# Altium footprint library domino-rising-cage-clamp.PcbLib: 435 footprints (part 6 of 28)
Each footprint in its own frame and in the unit in brackets; x right, y up, seen from the top. Pads: shape width x height; smd on the part's side, far side on the other; paste and mask are expansions set on the pad; w line width, h text height; cw(c..) or ccw(c..) is an arc to the next point about the centre after c.
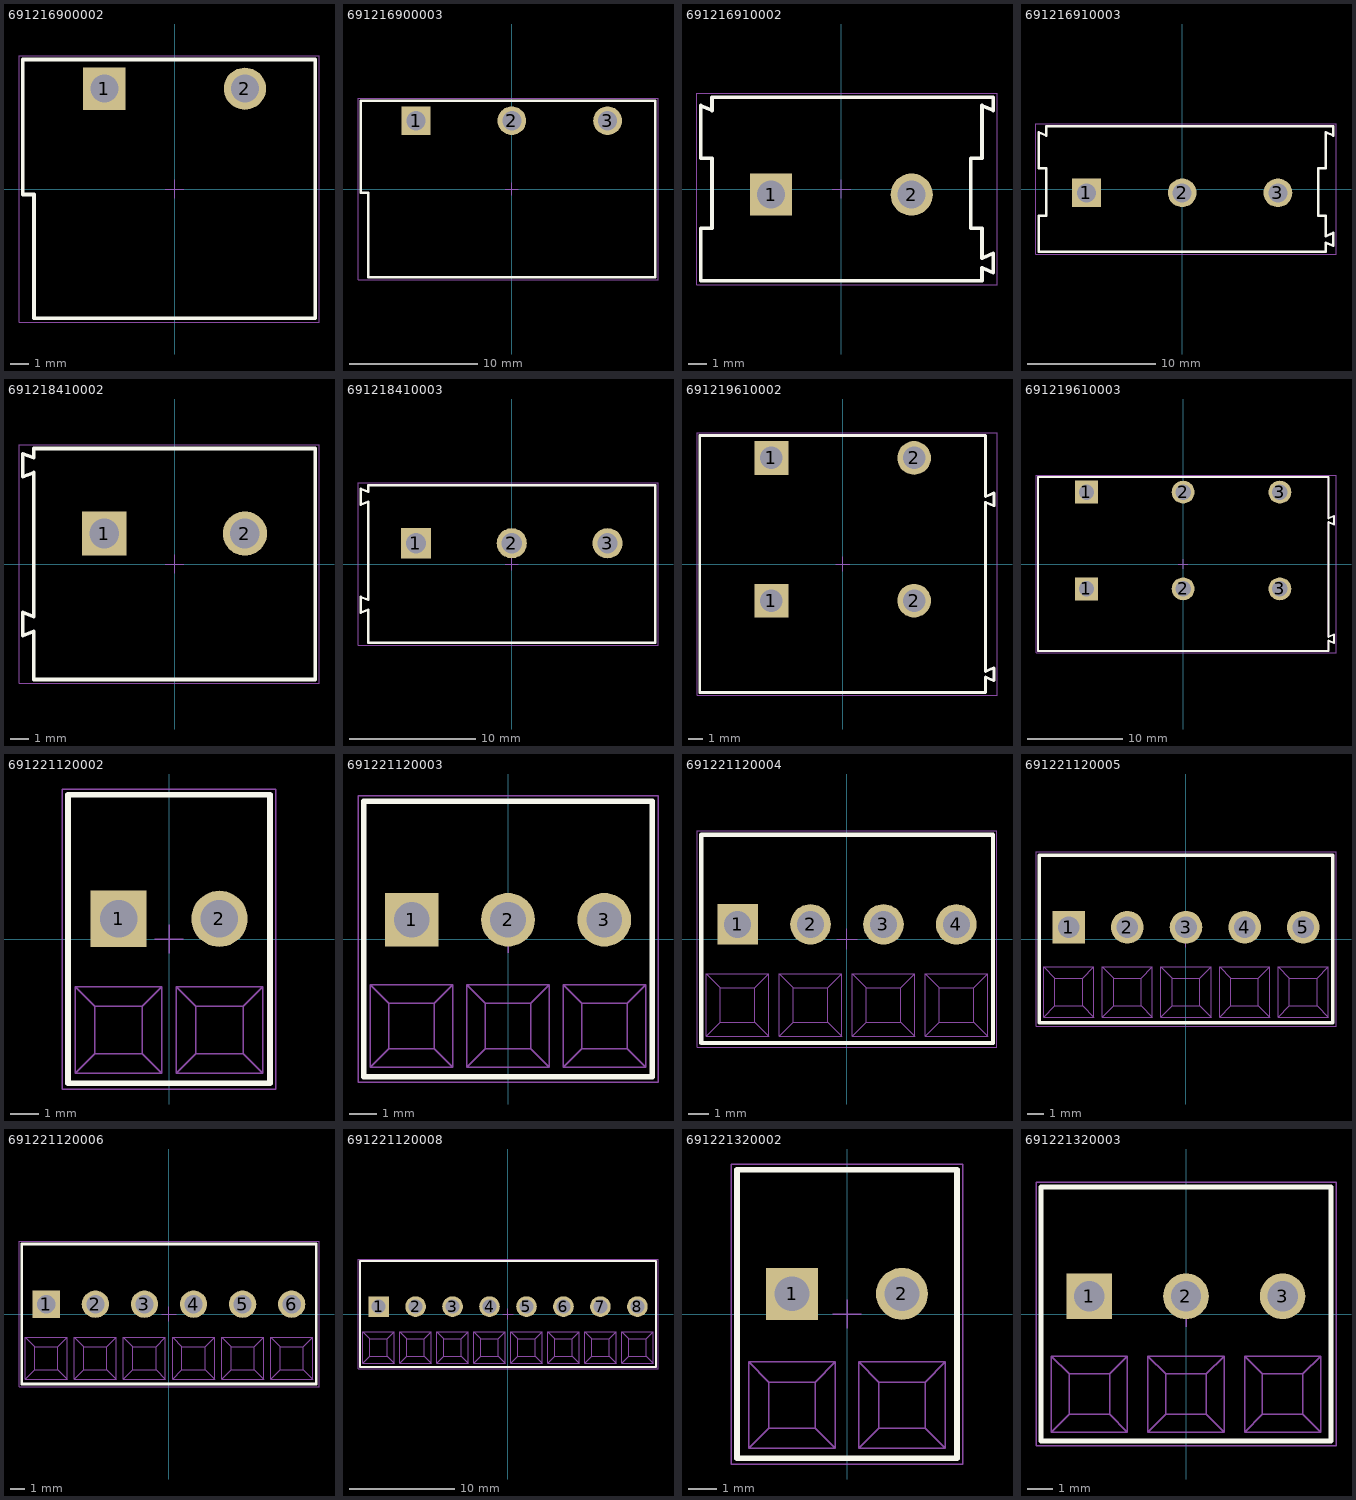
[diagram p5: the footprints below, top view; thin cyan lines are the x and y axes]

## 691216900002 [mm] "Vertical Cable Entry with Rising Cage Clamp, pitch 7.5mm, 02p"
height 9.8
pads (2):
  rect 2.25x2.25 hole 1.5: 1(-3.75,5.35)
  round 2.25 hole 1.5: 2(3.75,5.35)
Top Overlay:
  lines w0.2: -8.1,-0.3 -7.5,-0.3 -7.5,-6.9 7.5,-6.9 7.5,6.9 -8.1,6.9 -8.1,-0.3
Mechanical 13:
  lines w0.1: -8.1,-0.3 -8.1,6.9 7.5,6.9 7.5,-6.9 -7.5,-6.9 -7.5,-0.3 -8.1,-0.3
Mechanical 15:
  lines w0.05: -0.5,0 0.5,0 ; 0,-0.5 0,0.5 ; -8.3,-7.1 -8.3,7.1 7.7,7.1 7.7,-7.1 -8.3,-7.1
3D body "691216900002.stp": height 9.9, standoff -3.4, extent -8.1,-6.9 7.5,6.9

## 691216900003 [mm] "Vertical Cable Entry with Rising Cage Clamp, pitch 7.5mm, 03p"
height 9.8
pads (3):
  rect 2.25x2.25 hole 1.5: 1(-7.5,5.35)
  round 2.25 hole 1.5: 2(0,5.35) 3(7.5,5.35)
Top Overlay:
  lines w0.2: -11.85,-0.3 -11.25,-0.3 -11.25,-6.9 11.25,-6.9 11.25,6.9 -11.85,6.9 -11.85,-0.3
Mechanical 13:
  lines w0.1: -11.85,-0.3 -11.85,6.9 11.25,6.9 11.25,-6.9 -11.25,-6.9 -11.25,-0.3 -11.85,-0.3
Mechanical 15:
  lines w0.05: -0.5,0 0.5,0 ; 0,-0.5 0,0.5 ; -12.05,-7.1 -12.05,7.1 11.45,7.1 11.45,-7.1 -12.05,-7.1
3D body "691216900003.stp": height 9.9, standoff -3.4, extent -11.85,-6.9 11.25,6.9

## 691216910002 [mm] "Serie 2169 - 7.50 mm _ 2 pins"
height 13.8
pads (2):
  rect 2.25x2.25 hole 1.5: 1(-3.75,-0.3)
  round 2.25 hole 1.5: 2(3.75,-0.3)
Top Overlay:
  lines w0.2: -7.5,-4.9 -7.5,-2.09 -6.9,-2.09 -6.9,1.64 -7.5,1.64 -7.5,4.45 -6.9,4.19 -6.9,4.9 8.1,4.9 8.1,4.19 7.5,4.45 7.5,1.64 6.9,1.64 6.9,-2.09 7.5,-2.09 7.5,-3.69 8.1,-3.43 8.1,-4.46 7.5,-4.2 7.5,-4.9 -7.5,-4.9
Mechanical 13:
  lines w0.1: -7.5,-4.9 7.5,-4.9 7.5,-4.2 8.1,-4.46 8.1,-3.43 7.5,-3.69 7.5,-2.09 6.9,-2.09 6.9,1.64 7.5,1.64 7.5,4.45 8.1,4.19 8.1,4.9 -6.9,4.9 -6.9,4.19 -7.5,4.45 -7.5,1.64 -6.9,1.64 -6.9,-2.09 -7.5,-2.09 -7.5,-4.9
Mechanical 15:
  lines w0.05: -0.5,0 0.5,0 ; 0,-0.5 0,0.5 ; -7.7,-5.1 8.3,-5.1 8.3,5.1 -7.7,5.1 -7.7,-5.1
3D body "691216910002.stp": height 13.85, standoff -3.45, extent -7.5,-4.9 8.1,4.9

## 691216910003 [mm] "Serie 2169 - 7.50 mm _ 3 pins"
height 13.8
pads (3):
  rect 2.25x2.25 hole 1.5: 1(-7.5,-0.3)
  round 2.25 hole 1.5: 2(0,-0.3) 3(7.5,-0.3)
Top Overlay:
  lines w0.2: -11.25,-4.9 11.25,-4.9 11.25,-4.2 11.85,-4.46 11.85,-3.43 11.25,-3.69 11.25,-2.09 10.65,-2.09 10.65,1.64 11.25,1.64 11.25,4.45 11.85,4.19 11.85,4.9 -10.65,4.9 -10.65,4.19 -11.25,4.45 -11.25,1.64 -10.65,1.64 -10.65,-2.09 -11.25,-2.09 -11.25,-4.9
Mechanical 13:
  lines w0.1: -11.25,-4.9 -11.25,-2.09 -10.65,-2.09 -10.65,1.64 -11.25,1.64 -11.25,4.45 -10.65,4.19 -10.65,4.9 11.85,4.9 11.85,4.19 11.25,4.45 11.25,1.64 10.65,1.64 10.65,-2.09 11.25,-2.09 11.25,-3.69 11.85,-3.43 11.85,-4.46 11.25,-4.2 11.25,-4.9 -11.25,-4.9
Mechanical 15:
  lines w0.05: -0.5,0 0.5,0 ; 0,-0.5 0,0.5 ; -11.45,-5.1 -11.45,5.1 12.05,5.1 12.05,-5.1 -11.45,-5.1
3D body "691216910003.stp": height 13.85, standoff -3.45, extent -11.25,-4.9 11.85,4.9

## 691218410002 [mm] "Horizontal Entry Modular with Rising Cage Clamp, pitch 7.62mm, 2pin"
height 21.5
pads (2):
  rect 2.4x2.4 hole 1.6: 1(-3.81,1.65)
  round 2.4 hole 1.6: 2(3.81,1.65)
Top Overlay:
  lines w0.2: -8.22,-3.875 -8.22,-2.625 -7.62,-2.85 -7.62,4.95 -8.22,4.725 -8.22,5.975 -7.62,5.75 -7.62,6.25 7.62,6.25 7.62,-6.25 -7.62,-6.25 -7.62,-3.65 -8.22,-3.875
Mechanical 13:
  lines w0.1: -8.22,-3.875 -7.62,-3.65 -7.62,-6.25 7.62,-6.25 7.62,6.25 -7.62,6.25 -7.62,5.75 -8.22,5.975 -8.22,4.725 -7.62,4.95 -7.62,-2.85 -8.22,-2.625 -8.22,-3.875
Mechanical 15:
  lines w0.05: -0.5,0 0.5,0 ; 0,-0.5 0,0.5 ; -8.42,-6.45 -8.42,6.45 7.82,6.45 7.82,-6.45 -8.42,-6.45
3D body "691218410002.stp": height 21.53, standoff -4.17, extent -8.21,-6.25 7.63,6.25

## 691218410003 [mm] "Horizontal Entry Modular with Rising Cage Clamp, pitch 7.62mm, 3pin"
height 21.5
pads (3):
  rect 2.4x2.4 hole 1.6: 1(-7.62,1.65)
  round 2.4 hole 1.6: 2(0,1.65) 3(7.62,1.65)
Top Overlay:
  lines w0.2: -12.03,-3.875 -11.43,-3.65 -11.43,-6.25 11.43,-6.25 11.43,6.25 -11.43,6.25 -11.43,5.75 -12.03,5.975 -12.03,4.725 -11.43,4.95 -11.43,-2.85 -12.03,-2.625 -12.03,-3.875
Mechanical 13:
  lines w0.1: -12.03,-3.875 -12.03,-2.625 -11.43,-2.85 -11.43,4.95 -12.03,4.725 -12.03,5.975 -11.43,5.75 -11.43,6.25 11.43,6.25 11.43,-6.25 -11.43,-6.25 -11.43,-3.65 -12.03,-3.875
Mechanical 15:
  lines w0.05: -0.5,0 0.5,0 ; 0,-0.5 0,0.5 ; -12.23,-6.45 11.63,-6.45 11.63,6.45 -12.23,6.45 -12.23,-6.45
3D body "691218410003.stp": height 21.53, standoff -4.17, extent -12.03,-6.25 11.43,6.25

## 691219610002 [mm] "Serie 2196 - 10.16 mm Horizontal Entry Modular WR-TBL, 2 pin"
height 28.5
pads (4):
  rect 2.4x2.4 hole 1.6: 1(-5.08,-2.61) 1(-5.08,7.55)
  round 2.4 hole 1.6: 2(5.08,-2.61) 2(5.08,7.55)
Top Overlay:
  lines w0.2: 10.76,-8.301 10.16,-8.05 10.16,-9.15 -10.18,-9.15 -10.18,9.15 10.16,9.15 10.16,4.8 10.76,5.051 ; 10.76,-8.3 10.76,-7.4 10.16,-7.651 10.16,4.4 10.76,4.149 ; 10.76,4.15 10.76,5.05
Mechanical 13:
  lines w0.1: 10.76,-8.301 10.16,-8.05 10.16,-9.15 -10.18,-9.15 -10.18,9.15 10.16,9.15 10.16,4.8 10.76,5.051 ; 10.76,-8.3 10.76,-7.4 10.16,-7.651 10.16,4.4 10.76,4.149 ; 10.76,4.15 10.76,5.05
Mechanical 15:
  lines w0.05: -0.5,0 0.5,0 ; 0,-0.5 0,0.5 ; -10.38,-9.35 -10.38,9.35 10.98,9.35 10.98,-9.35 -10.38,-9.35
3D body "691219610002.stp": height 28.6, standoff -4.5, extent -10.18,-9.15 10.74,9.15

## 691219610003 [mm] "Serie 2196 - 10.16 mm Horizontal Entry Modular WR-TBL, 3 pin"
height 28.5
pads (6):
  rect 2.4x2.4 hole 1.6: 1(-10.16,-2.61) 1(-10.16,7.55)
  round 2.4 hole 1.6: 2(0,-2.61) 2(0,7.55) 3(10.16,-2.61) 3(10.16,7.55)
Top Overlay:
  lines w0.2: 15.86,-8.301 15.26,-8.05 15.26,-9.15 -15.26,-9.15 -15.26,9.15 15.26,9.15 15.26,4.8 15.86,5.051 ; 15.86,-8.3 15.86,-7.4 15.26,-7.651 15.26,4.4 15.86,4.149 ; 15.86,4.15 15.86,5.05
Mechanical 13:
  lines w0.1: 15.86,-8.301 15.26,-8.05 15.26,-9.15 -15.26,-9.15 -15.26,9.15 15.26,9.15 15.26,4.8 15.86,5.051 ; 15.86,-8.3 15.86,-7.4 15.26,-7.651 15.26,4.4 15.86,4.149 ; 15.86,4.15 15.86,5.05
Mechanical 15:
  lines w0.05: -0.5,0 0.5,0 ; 0,-0.5 0,0.5 ; -15.46,-9.35 -15.46,9.35 16.06,9.35 16.06,-9.35 -15.46,-9.35
3D body "691219610003.stp": height 28.6, standoff -4.5, extent -15.26,-9.15 15.82,9.15

## 691221120002 [mm] "3.50 mm 55¡ã Entry, 2p"
height 9.47
pads (2):
  rect 1.95x1.95 hole 1.3: 1(-1.75,0.7)
  round 1.95 hole 1.3: 2(1.75,0.7)
Top Overlay:
  lines w0.2: -3.5,-5 -3.5,5 3.5,5 3.5,-5 -3.5,-5
Mechanical 13:
  lines w0.05: -3.25,-4.66 -2.575,-3.985 ; -3.25,-4.66 -3.25,-1.66 ; -3.25,-4.66 -0.25,-4.66 ; -3.25,-1.66 -2.575,-2.335 ; -3.25,-1.66 -0.25,-1.66 ; -2.575,-3.985 -2.575,-2.335 ; -2.575,-3.985 -0.925,-3.985 ; -2.575,-2.335 -0.925,-2.335 ; -0.925,-3.985 -0.25,-4.66 ; -0.925,-3.985 -0.925,-2.335 ; -0.925,-2.335 -0.25,-1.66 ; -0.25,-4.66 -0.25,-1.66 ; 0.25,-4.66 3.25,-4.66 ; 0.25,-4.66 0.25,-1.66 ; 0.25,-4.66 0.925,-3.985 ; 0.25,-1.66 3.25,-1.66 ; 0.25,-1.66 0.925,-2.335 ; 0.925,-3.985 2.575,-3.985 ; 0.925,-3.985 0.925,-2.335 ; 0.925,-2.335 2.575,-2.335 ; 2.575,-3.985 2.575,-2.335 ; 2.575,-3.985 3.25,-4.66 ; 2.575,-2.335 3.25,-1.66 ; 3.25,-4.66 3.25,-1.66
  lines w0.1: -3.5,-5 3.5,-5 3.5,5 -3.5,5 -3.5,-5
Mechanical 15:
  lines w0.05: -0.5,0 0.5,0 ; 0,-0.5 0,0.5 ; -3.7,-5.2 3.7,-5.2 3.7,5.2 -3.7,5.2 -3.7,-5.2
3D body "691221120002.stp": height 9.54, standoff -3.43, extent -3.5,-5 3.5,5

## 691221120003 [mm] "3.50 mm 55¡ã Entry, 3p"
height 9.47
pads (3):
  rect 1.95x1.95 hole 1.3: 1(-3.5,0.7)
  round 1.95 hole 1.3: 2(0,0.7) 3(3.5,0.7)
Top Overlay:
  lines w0.2: -5.25,-5 5.25,-5 5.25,5 -5.25,5 -5.25,-5
Mechanical 13:
  lines w0.05: -5,-4.66 -2,-4.66 ; -5,-4.66 -5,-1.66 ; -5,-4.66 -4.325,-3.985 ; -5,-1.66 -2,-1.66 ; -5,-1.66 -4.325,-2.335 ; -4.325,-3.985 -2.675,-3.985 ; -4.325,-3.985 -4.325,-2.335 ; -4.325,-2.335 -2.675,-2.335 ; -2.675,-3.985 -2.675,-2.335 ; -2.675,-3.985 -2,-4.66 ; -2.675,-2.335 -2,-1.66 ; -2,-4.66 -2,-1.66 ; -1.5,-4.66 1.5,-4.66 ; -1.5,-4.66 -1.5,-1.66 ; -1.5,-4.66 -0.825,-3.985 ; -1.5,-1.66 1.5,-1.66 ; -1.5,-1.66 -0.825,-2.335 ; -0.825,-3.985 0.825,-3.985 ; -0.825,-3.985 -0.825,-2.335 ; -0.825,-2.335 0.825,-2.335 ; 0.825,-3.985 0.825,-2.335 ; 0.825,-3.985 1.5,-4.66 ; 0.825,-2.335 1.5,-1.66 ; 1.5,-4.66 1.5,-1.66 ; 2,-4.66 2.675,-3.985 ; 2,-4.66 2,-1.66 ; 2,-4.66 5,-4.66 ; 2,-1.66 2.675,-2.335 ; 2,-1.66 5,-1.66 ; 2.675,-3.985 2.675,-2.335 ; 2.675,-3.985 4.325,-3.985 ; 2.675,-2.335 4.325,-2.335 ; 4.325,-3.985 5,-4.66 ; 4.325,-3.985 4.325,-2.335 ; 4.325,-2.335 5,-1.66 ; 5,-4.66 5,-1.66
  lines w0.1: -5.25,-5 -5.25,5 5.25,5 5.25,-5 -5.25,-5
Mechanical 15:
  lines w0.05: -0.5,0 0.5,0 ; 0,-0.5 0,0.5 ; -5.45,-5.2 -5.45,5.2 5.45,5.2 5.45,-5.2 -5.45,-5.2
3D body "691221120003.stp": height 9.54, standoff -3.43, extent -5.25,-5 5.25,5

## 691221120004 [mm] "3.50 mm 55¡ã Entry, 4p"
height 9.47
pads (4):
  rect 1.95x1.95 hole 1.3: 1(-5.25,0.7)
  round 1.95 hole 1.3: 2(-1.75,0.7) 3(1.75,0.7) 4(5.25,0.7)
Top Overlay:
  lines w0.2: -7,-5 -7,5 7,5 7,-5 -7,-5
Mechanical 13:
  lines w0.05: -6.75,-4.66 -3.75,-4.66 ; -6.75,-4.66 -6.75,-1.66 ; -6.75,-4.66 -6.075,-3.985 ; -6.75,-1.66 -3.75,-1.66 ; -6.75,-1.66 -6.075,-2.335 ; -6.075,-3.985 -4.425,-3.985 ; -6.075,-3.985 -6.075,-2.335 ; -6.075,-2.335 -4.425,-2.335 ; -4.425,-3.985 -4.425,-2.335 ; -4.425,-3.985 -3.75,-4.66 ; -4.425,-2.335 -3.75,-1.66 ; -3.75,-4.66 -3.75,-1.66 ; -3.25,-4.66 -2.575,-3.985 ; -3.25,-4.66 -3.25,-1.66 ; -3.25,-4.66 -0.25,-4.66 ; -3.25,-1.66 -2.575,-2.335 ; -3.25,-1.66 -0.25,-1.66 ; -2.575,-3.985 -2.575,-2.335 ; -2.575,-3.985 -0.925,-3.985 ; -2.575,-2.335 -0.925,-2.335 ; -0.925,-3.985 -0.25,-4.66 ; -0.925,-3.985 -0.925,-2.335 ; -0.925,-2.335 -0.25,-1.66 ; -0.25,-4.66 -0.25,-1.66 ; 0.25,-4.66 3.25,-4.66 ; 0.25,-4.66 0.25,-1.66 ; 0.25,-4.66 0.925,-3.985 ; 0.25,-1.66 3.25,-1.66 ; 0.25,-1.66 0.925,-2.335 ; 0.925,-3.985 2.575,-3.985 ; 0.925,-3.985 0.925,-2.335 ; 0.925,-2.335 2.575,-2.335 ; 2.575,-3.985 2.575,-2.335 ; 2.575,-3.985 3.25,-4.66 ; 2.575,-2.335 3.25,-1.66 ; 3.25,-4.66 3.25,-1.66 ; 3.75,-4.66 4.425,-3.985 ; 3.75,-4.66 3.75,-1.66 ; 3.75,-4.66 6.75,-4.66 ; 3.75,-1.66 4.425,-2.335 ; 3.75,-1.66 6.75,-1.66 ; 4.425,-3.985 4.425,-2.335 ; 4.425,-3.985 6.075,-3.985 ; 4.425,-2.335 6.075,-2.335 ; 6.075,-3.985 6.75,-4.66 ; 6.075,-3.985 6.075,-2.335 ; 6.075,-2.335 6.75,-1.66 ; 6.75,-4.66 6.75,-1.66
  lines w0.1: -7,-5 7,-5 7,5 -7,5 -7,-5
Mechanical 15:
  lines w0.05: -0.5,0 0.5,0 ; 0,-0.5 0,0.5 ; -7.2,-5.2 7.2,-5.2 7.2,5.2 -7.2,5.2 -7.2,-5.2
3D body "691221120004.stp": height 9.54, standoff -3.43, extent -7,-5 7,5

## 691221120005 [mm] "3.50 mm 55¡ã Entry, 5p"
height 9.47
pads (5):
  rect 1.95x1.95 hole 1.3: 1(-7,0.7)
  round 1.95 hole 1.3: 2(-3.5,0.7) 3(0,0.7) 4(3.5,0.7) 5(7,0.7)
Top Overlay:
  lines w0.2: -8.75,-5 8.75,-5 8.75,5 -8.75,5 -8.75,-5
Mechanical 13:
  lines w0.05: -8.5,-4.66 -5.5,-4.66 ; -8.5,-4.66 -8.5,-1.66 ; -8.5,-4.66 -7.825,-3.985 ; -8.5,-1.66 -5.5,-1.66 ; -8.5,-1.66 -7.825,-2.335 ; -7.825,-3.985 -6.175,-3.985 ; -7.825,-3.985 -7.825,-2.335 ; -7.825,-2.335 -6.175,-2.335 ; -6.175,-3.985 -6.175,-2.335 ; -6.175,-3.985 -5.5,-4.66 ; -6.175,-2.335 -5.5,-1.66 ; -5.5,-4.66 -5.5,-1.66 ; -5,-4.66 -2,-4.66 ; -5,-4.66 -5,-1.66 ; -5,-4.66 -4.325,-3.985 ; -5,-1.66 -2,-1.66 ; -5,-1.66 -4.325,-2.335 ; -4.325,-3.985 -2.675,-3.985 ; -4.325,-3.985 -4.325,-2.335 ; -4.325,-2.335 -2.675,-2.335 ; -2.675,-3.985 -2.675,-2.335 ; -2.675,-3.985 -2,-4.66 ; -2.675,-2.335 -2,-1.66 ; -2,-4.66 -2,-1.66 ; -1.5,-4.66 -0.825,-3.985 ; -1.5,-4.66 -1.5,-1.66 ; -1.5,-4.66 1.5,-4.66 ; -1.5,-1.66 -0.825,-2.335 ; -1.5,-1.66 1.5,-1.66 ; -0.825,-3.985 -0.825,-2.335 ; -0.825,-3.985 0.825,-3.985 ; -0.825,-2.335 0.825,-2.335 ; 0.825,-3.985 1.5,-4.66 ; 0.825,-3.985 0.825,-2.335 ; 0.825,-2.335 1.5,-1.66 ; 1.5,-4.66 1.5,-1.66 ; 2,-4.66 5,-4.66 ; 2,-4.66 2,-1.66 ; 2,-4.66 2.675,-3.985 ; 2,-1.66 5,-1.66 ; 2,-1.66 2.675,-2.335 ; 2.675,-3.985 4.325,-3.985 ; 2.675,-3.985 2.675,-2.335 ; 2.675,-2.335 4.325,-2.335 ; 4.325,-3.985 4.325,-2.335 ; 4.325,-3.985 5,-4.66 ; 4.325,-2.335 5,-1.66 ; 5,-4.66 5,-1.66 ; 5.5,-4.66 6.175,-3.985 ; 5.5,-4.66 5.5,-1.66 ; 5.5,-4.66 8.5,-4.66 ; 5.5,-1.66 6.175,-2.335 ; 5.5,-1.66 8.5,-1.66 ; 6.175,-3.985 6.175,-2.335 ; 6.175,-3.985 7.825,-3.985 ; 6.175,-2.335 7.825,-2.335 ; 7.825,-3.985 8.5,-4.66 ; 7.825,-3.985 7.825,-2.335 ; 7.825,-2.335 8.5,-1.66 ; 8.5,-4.66 8.5,-1.66
  lines w0.1: -8.75,-5 -8.75,5 8.75,5 8.75,-5 -8.75,-5
Mechanical 15:
  lines w0.05: -0.5,0 0.5,0 ; 0,-0.5 0,0.5 ; -8.95,-5.2 -8.95,5.2 8.95,5.2 8.95,-5.2 -8.95,-5.2
3D body "691221120005.stp": height 9.54, standoff -3.43, extent -8.75,-5 8.75,5

## 691221120006 [mm] "3.50 mm 55¡ã Entry, 6p"
height 9.47
pads (6):
  rect 1.95x1.95 hole 1.3: 1(-8.75,0.7)
  round 1.95 hole 1.3: 2(-5.25,0.7) 3(-1.75,0.7) 4(1.75,0.7) 5(5.25,0.7) 6(8.75,0.7)
Top Overlay:
  lines w0.2: -10.5,-5 10.5,-5 10.5,5 -10.5,5 -10.5,-5
Mechanical 13:
  lines w0.05: -10.25,-4.66 -7.25,-4.66 ; -10.25,-4.66 -10.25,-1.66 ; -10.25,-4.66 -9.575,-3.985 ; -10.25,-1.66 -7.25,-1.66 ; -10.25,-1.66 -9.575,-2.335 ; -9.575,-3.985 -7.925,-3.985 ; -9.575,-3.985 -9.575,-2.335 ; -9.575,-2.335 -7.925,-2.335 ; -7.925,-3.985 -7.925,-2.335 ; -7.925,-3.985 -7.25,-4.66 ; -7.925,-2.335 -7.25,-1.66 ; -7.25,-4.66 -7.25,-1.66 ; -6.75,-4.66 -6.075,-3.985 ; -6.75,-4.66 -6.75,-1.66 ; -6.75,-4.66 -3.75,-4.66 ; -6.75,-1.66 -6.075,-2.335 ; -6.75,-1.66 -3.75,-1.66 ; -6.075,-3.985 -6.075,-2.335 ; -6.075,-3.985 -4.425,-3.985 ; -6.075,-2.335 -4.425,-2.335 ; -4.425,-3.985 -3.75,-4.66 ; -4.425,-3.985 -4.425,-2.335 ; -4.425,-2.335 -3.75,-1.66 ; -3.75,-4.66 -3.75,-1.66 ; -3.25,-4.66 -0.25,-4.66 ; -3.25,-4.66 -3.25,-1.66 ; -3.25,-4.66 -2.575,-3.985 ; -3.25,-1.66 -0.25,-1.66 ; -3.25,-1.66 -2.575,-2.335 ; -2.575,-3.985 -0.925,-3.985 ; -2.575,-3.985 -2.575,-2.335 ; -2.575,-2.335 -0.925,-2.335 ; -0.925,-3.985 -0.925,-2.335 ; -0.925,-3.985 -0.25,-4.66 ; -0.925,-2.335 -0.25,-1.66 ; -0.25,-4.66 -0.25,-1.66 ; 0.25,-4.66 0.925,-3.985 ; 0.25,-4.66 0.25,-1.66 ; 0.25,-4.66 3.25,-4.66 ; 0.25,-1.66 0.925,-2.335 ; 0.25,-1.66 3.25,-1.66 ; 0.925,-3.985 0.925,-2.335 ; 0.925,-3.985 2.575,-3.985 ; 0.925,-2.335 2.575,-2.335 ; 2.575,-3.985 3.25,-4.66 ; 2.575,-3.985 2.575,-2.335 ; 2.575,-2.335 3.25,-1.66 ; 3.25,-4.66 3.25,-1.66 ; 3.75,-4.66 6.75,-4.66 ; 3.75,-4.66 3.75,-1.66 ; 3.75,-4.66 4.425,-3.985 ; 3.75,-1.66 6.75,-1.66 ; 3.75,-1.66 4.425,-2.335 ; 4.425,-3.985 6.075,-3.985 ; 4.425,-3.985 4.425,-2.335 ; 4.425,-2.335 6.075,-2.335 ; 6.075,-3.985 6.075,-2.335 ; 6.075,-3.985 6.75,-4.66 ; 6.075,-2.335 6.75,-1.66 ; 6.75,-4.66 6.75,-1.66 ; 7.25,-4.66 7.925,-3.985 ; 7.25,-4.66 7.25,-1.66 ; 7.25,-4.66 10.25,-4.66 ; 7.25,-1.66 7.925,-2.335 ; 7.25,-1.66 10.25,-1.66 ; 7.925,-3.985 7.925,-2.335 ; 7.925,-3.985 9.575,-3.985 ; 7.925,-2.335 9.575,-2.335 ; 9.575,-3.985 10.25,-4.66 ; 9.575,-3.985 9.575,-2.335 ; 9.575,-2.335 10.25,-1.66 ; 10.25,-4.66 10.25,-1.66
  lines w0.1: -10.5,-5 -10.5,5 10.5,5 10.5,-5 -10.5,-5
Mechanical 15:
  lines w0.05: -0.5,0 0.5,0 ; 0,-0.5 0,0.5 ; -10.7,-5.2 -10.7,5.2 10.7,5.2 10.7,-5.2 -10.7,-5.2
3D body "691221120006.stp": height 9.54, standoff -3.43, extent -10.5,-5 10.5,5

## 691221120008 [mm] "3.50 mm 55¡ã Entry, 8p"
height 9.47
pads (8):
  rect 1.95x1.95 hole 1.3: 1(-12.25,0.7)
  round 1.95 hole 1.3: 2(-8.75,0.7) 3(-5.25,0.7) 4(-1.75,0.7) 5(1.75,0.7) 6(5.25,0.7) 7(8.75,0.7) 8(12.25,0.7)
Top Overlay:
  lines w0.2: -14,-5 -14,5 14,5 14,-5 -14,-5
Mechanical 13:
  lines w0.05: -13.75,-4.66 -13.075,-3.985 ; -13.75,-4.66 -13.75,-1.66 ; -13.75,-4.66 -10.75,-4.66 ; -13.75,-1.66 -13.075,-2.335 ; -13.75,-1.66 -10.75,-1.66 ; -13.075,-3.985 -13.075,-2.335 ; -13.075,-3.985 -11.425,-3.985 ; -13.075,-2.335 -11.425,-2.335 ; -11.425,-3.985 -10.75,-4.66 ; -11.425,-3.985 -11.425,-2.335 ; -11.425,-2.335 -10.75,-1.66 ; -10.75,-4.66 -10.75,-1.66 ; -10.25,-4.66 -7.25,-4.66 ; -10.25,-4.66 -10.25,-1.66 ; -10.25,-4.66 -9.575,-3.985 ; -10.25,-1.66 -7.25,-1.66 ; -10.25,-1.66 -9.575,-2.335 ; -9.575,-3.985 -7.925,-3.985 ; -9.575,-3.985 -9.575,-2.335 ; -9.575,-2.335 -7.925,-2.335 ; -7.925,-3.985 -7.925,-2.335 ; -7.925,-3.985 -7.25,-4.66 ; -7.925,-2.335 -7.25,-1.66 ; -7.25,-4.66 -7.25,-1.66 ; -6.75,-4.66 -3.75,-4.66 ; -6.75,-4.66 -6.75,-1.66 ; -6.75,-4.66 -6.075,-3.985 ; -6.75,-1.66 -3.75,-1.66 ; -6.75,-1.66 -6.075,-2.335 ; -6.075,-3.985 -4.425,-3.985 ; -6.075,-3.985 -6.075,-2.335 ; -6.075,-2.335 -4.425,-2.335 ; -4.425,-3.985 -4.425,-2.335 ; -4.425,-3.985 -3.75,-4.66 ; -4.425,-2.335 -3.75,-1.66 ; -3.75,-4.66 -3.75,-1.66 ; -3.25,-4.66 -0.25,-4.66 ; -3.25,-4.66 -3.25,-1.66 ; -3.25,-4.66 -2.575,-3.985 ; -3.25,-1.66 -0.25,-1.66 ; -3.25,-1.66 -2.575,-2.335 ; -2.575,-3.985 -0.925,-3.985 ; -2.575,-3.985 -2.575,-2.335 ; -2.575,-2.335 -0.925,-2.335 ; -0.925,-3.985 -0.925,-2.335 ; -0.925,-3.985 -0.25,-4.66 ; -0.925,-2.335 -0.25,-1.66 ; -0.25,-4.66 -0.25,-1.66 ; 0.25,-4.66 3.25,-4.66 ; 0.25,-4.66 0.25,-1.66 ; 0.25,-4.66 0.925,-3.985 ; 0.25,-1.66 3.25,-1.66 ; 0.25,-1.66 0.925,-2.335 ; 0.925,-3.985 2.575,-3.985 ; 0.925,-3.985 0.925,-2.335 ; 0.925,-2.335 2.575,-2.335 ; 2.575,-3.985 2.575,-2.335 ; 2.575,-3.985 3.25,-4.66 ; 2.575,-2.335 3.25,-1.66 ; 3.25,-4.66 3.25,-1.66 ; 3.75,-4.66 6.75,-4.66 ; 3.75,-4.66 3.75,-1.66 ; 3.75,-4.66 4.425,-3.985 ; 3.75,-1.66 6.75,-1.66 ; 3.75,-1.66 4.425,-2.335 ; 4.425,-3.985 6.075,-3.985 ; 4.425,-3.985 4.425,-2.335 ; 4.425,-2.335 6.075,-2.335 ; 6.075,-3.985 6.075,-2.335 ; 6.075,-3.985 6.75,-4.66 ; 6.075,-2.335 6.75,-1.66 ; 6.75,-4.66 6.75,-1.66 ; 7.25,-4.66 10.25,-4.66 ; 7.25,-4.66 7.25,-1.66 ; 7.25,-4.66 7.925,-3.985 ; 7.25,-1.66 10.25,-1.66 ; 7.25,-1.66 7.925,-2.335 ; 7.925,-3.985 9.575,-3.985 ; 7.925,-3.985 7.925,-2.335 ; 7.925,-2.335 9.575,-2.335 ; 9.575,-3.985 9.575,-2.335 ; 9.575,-3.985 10.25,-4.66 ; 9.575,-2.335 10.25,-1.66 ; 10.25,-4.66 10.25,-1.66 ; 10.75,-4.66 13.75,-4.66 ; 10.75,-4.66 10.75,-1.66 ; 10.75,-4.66 11.425,-3.985 ; 10.75,-1.66 13.75,-1.66 ; 10.75,-1.66 11.425,-2.335 ; 11.425,-3.985 13.075,-3.985 ; 11.425,-3.985 11.425,-2.335 ; 11.425,-2.335 13.075,-2.335 ; 13.075,-3.985 13.075,-2.335 ; 13.075,-3.985 13.75,-4.66 ; 13.075,-2.335 13.75,-1.66 ; 13.75,-4.66 13.75,-1.66
  lines w0.1: -14,-5 14,-5 14,5 -14,5 -14,-5
Mechanical 15:
  lines w0.05: -0.5,0 0.5,0 ; 0,-0.5 0,0.5 ; -14.2,-5.2 14.2,-5.2 14.2,5.2 -14.2,5.2 -14.2,-5.2
3D body "691221120008.stp": height 9.54, standoff -3.43, extent -14,-5 14,5

## 691221320002 [mm] "3,81mm - modular - green - 55¡ã wire entry - Cage clamp - 02p"
height 9.5
pads (2):
  rect 1.8x1.8 hole 1.2: 1(-1.905,0.7)
  round 1.8 hole 1.2: 2(1.905,0.7)
Top Overlay:
  lines w0.2: -3.81,-5 3.81,-5 3.81,5 -3.81,5 -3.81,-5
Mechanical 13:
  lines w0.05: -3.405,-4.66 -0.405,-4.66 ; -3.405,-4.66 -3.405,-1.66 ; -3.405,-4.66 -2.705,-3.96 ; -3.405,-1.66 -0.405,-1.66 ; -3.405,-1.66 -2.705,-2.36 ; -2.705,-3.96 -2.705,-2.36 ; -2.705,-3.96 -1.105,-3.96 ; -2.705,-2.36 -1.105,-2.36 ; -1.105,-3.96 -1.105,-2.36 ; -1.105,-3.96 -0.405,-4.66 ; -1.105,-2.36 -0.405,-1.66 ; -0.405,-4.66 -0.405,-1.66 ; 0.405,-4.66 1.105,-3.96 ; 0.405,-4.66 0.405,-1.66 ; 0.405,-4.66 3.405,-4.66 ; 0.405,-1.66 1.105,-2.36 ; 0.405,-1.66 3.405,-1.66 ; 1.105,-3.96 2.705,-3.96 ; 1.105,-3.96 1.105,-2.36 ; 1.105,-2.36 2.705,-2.36 ; 2.705,-3.96 3.405,-4.66 ; 2.705,-3.96 2.705,-2.36 ; 2.705,-2.36 3.405,-1.66 ; 3.405,-4.66 3.405,-1.66
  lines w0.1: -3.81,-5 -3.81,5 3.81,5 3.81,-5 -3.81,-5
Mechanical 15:
  lines w0.05: -0.5,0 0.5,0 ; 0,-0.5 0,0.5 ; -4.01,-5.2 4.01,-5.2 4.01,5.2 -4.01,5.2 -4.01,-5.2
3D body "691221320002.stp": height 9.55, standoff -3.45, extent -3.81,-5 3.81,5

## 691221320003 [mm] "3,81mm - modular - green - 55¡ã wire entry - Cage clamp - 03p"
height 9.5
pads (3):
  rect 1.8x1.8 hole 1.2: 1(-3.81,0.7)
  round 1.8 hole 1.2: 2(0,0.7) 3(3.81,0.7)
Top Overlay:
  lines w0.2: -5.715,-5 -5.715,5 5.715,5 5.715,-5 -5.715,-5
Mechanical 13:
  lines w0.05: -5.31,-4.66 -4.61,-3.96 ; -5.31,-4.66 -5.31,-1.66 ; -5.31,-4.66 -2.31,-4.66 ; -5.31,-1.66 -4.61,-2.36 ; -5.31,-1.66 -2.31,-1.66 ; -4.61,-3.96 -3.01,-3.96 ; -4.61,-3.96 -4.61,-2.36 ; -4.61,-2.36 -3.01,-2.36 ; -3.01,-3.96 -2.31,-4.66 ; -3.01,-3.96 -3.01,-2.36 ; -3.01,-2.36 -2.31,-1.66 ; -2.31,-4.66 -2.31,-1.66 ; -1.5,-4.66 1.5,-4.66 ; -1.5,-4.66 -1.5,-1.66 ; -1.5,-4.66 -0.8,-3.96 ; -1.5,-1.66 1.5,-1.66 ; -1.5,-1.66 -0.8,-2.36 ; -0.8,-3.96 -0.8,-2.36 ; -0.8,-3.96 0.8,-3.96 ; -0.8,-2.36 0.8,-2.36 ; 0.8,-3.96 0.8,-2.36 ; 0.8,-3.96 1.5,-4.66 ; 0.8,-2.36 1.5,-1.66 ; 1.5,-4.66 1.5,-1.66 ; 2.31,-4.66 5.31,-4.66 ; 2.31,-4.66 2.31,-1.66 ; 2.31,-4.66 3.01,-3.96 ; 2.31,-1.66 5.31,-1.66 ; 2.31,-1.66 3.01,-2.36 ; 3.01,-3.96 3.01,-2.36 ; 3.01,-3.96 4.61,-3.96 ; 3.01,-2.36 4.61,-2.36 ; 4.61,-3.96 4.61,-2.36 ; 4.61,-3.96 5.31,-4.66 ; 4.61,-2.36 5.31,-1.66 ; 5.31,-4.66 5.31,-1.66
  lines w0.1: -5.715,-5 5.715,-5 5.715,5 -5.715,5 -5.715,-5
Mechanical 15:
  lines w0.05: -0.5,0 0.5,0 ; 0,-0.5 0,0.5 ; -5.915,-5.2 -5.915,5.2 5.915,5.2 5.915,-5.2 -5.915,-5.2
3D body "691221320003.stp": height 9.55, standoff -3.45, extent -5.715,-5 5.715,5